# Altium footprint library VEGG_PcbLib_ALT.PcbLib: 140 footprints (part 3 of 9)
Each footprint in its own frame and in the unit in brackets; x right, y up, seen from the top. Pads: shape width x height; smd on the part's side, far side on the other; paste and mask are expansions set on the pad; w line width, h text height; cw(c..) or ccw(c..) is an arc to the next point about the centre after c.
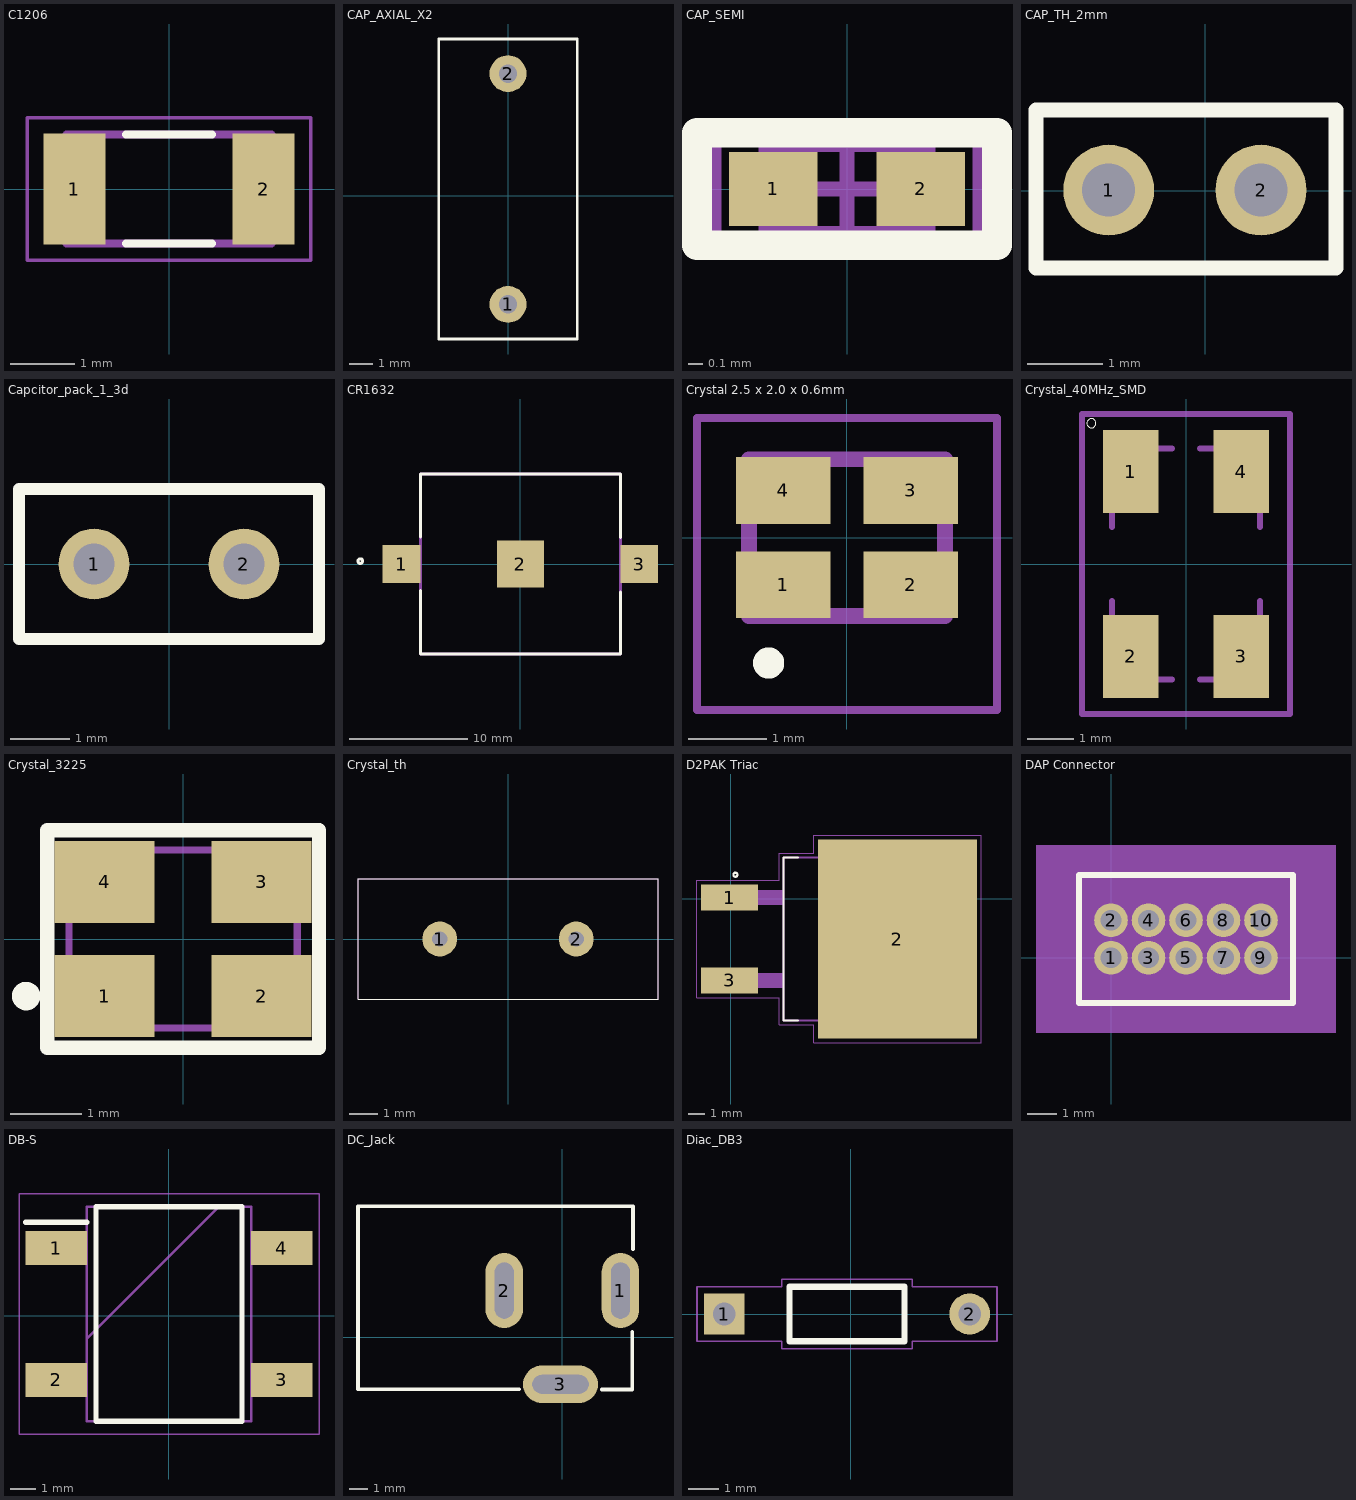
[diagram p2: the footprints below, top view; thin cyan lines are the x and y axes]

## C1206 [mm]
pads (2):
  rect 0.97x1.73 smd: 1(-1.48,0) 2(1.48,0)
Top Overlay:
  lines w0.127: -0.67,-0.85 0.67,-0.85 ; -0.67,0.85 0.67,0.85
Mechanical 4:
  lines w0.127: -1.6,-0.85 1.6,-0.85 ; -1.6,-0.85 -1.6,0.85 ; -1.6,-0.85 1.6,-0.85 ; -1.6,-0.85 -1.6,0.85 ; -1.6,0.85 1.6,0.85 ; -1.6,0.85 1.6,0.85 ; 1.6,-0.85 1.6,0.85 ; 1.6,-0.85 1.6,0.85
Mechanical 16:
  lines w0.05: -2.215,-1.115 2.215,-1.115 2.215,1.115 -2.215,1.115 -2.215,-1.115
3D body "User Library-1206 SMD Capacitor.x_t": height 1, standoff 0, extent -1.6,-0.8 1.6,0.8

## CAP_AXIAL_X2 [mil]
pads (2):
  round 63 hole 31.5: 1(0,-185.04) 2(0,208.66)
Top Overlay:
  lines w5: -118.11,-244.09 -118.11,267.72 118.11,267.72 118.11,-244.09 -118.11,-244.09 ; -118.11,248.03 -118.11,248.03
3D body: height 600, standoff 10, extent -120,-248.19 120,271.81

## CAP_SEMI [mm] "0402_PACK"
pads (2):
  rect 0.6x0.5 smd: 1(-0.5,0) 2(0.5,0)
Top Overlay:
  lines w0.2: -1.016,-0.381 -1.016,0.381 1.016,0.381 1.016,-0.381 -1.016,-0.381
Mechanical 13:
  lines w0.1: -0.55,-0.3 -0.55,0.3 0.55,0.3 0.55,-0.3 -0.55,-0.3
Mechanical 15:
  lines w0.1: -0.3,0 0.3,0 ; 0,-0.3 0,0.3 ; -0.9,-0.35 -0.9,0.35 0.9,0.35 0.9,-0.35 -0.9,-0.35
3D body "SW3dPS-0402 SMD Capacitor.STEP": height 0.12, standoff -0.08, extent -0.5,-0.3 0.5,0.3

## CAP_TH_2mm [mm]
pads (2):
  round 1.2 hole 0.7: 1(-1.275,0.01) 2(0.737,0.01)
Top Overlay:
  lines w0.2: -2.235,-1.016 1.727,-1.016 1.727,1.067 -2.235,1.067 -2.235,-1.016
3D body "User Library-Aluminum Electrolytic Capacitors.STEP": height 13, standoff -0.78, extent -2.979,-2.733 2.522,2.769

## Capcitor_pack_1_3d [mm]
pads (2):
  round 1.2 hole 0.7: 1(-1.27,0) 2(1.27,0)
Top Overlay:
  lines w0.2: -2.54,-1.27 2.54,-1.27 2.54,1.27 -2.54,1.27 -2.54,-1.27
3D body "Capacitor eletrolitico 100uFx35.STEP": height 11.61, standoff -2.39, extent -2.555,-2.56 2.555,2.54

## CR1632 [mm] "3012 keystone"
pads (3):
  rect 3.18x3.18 smd: 1(-10.02,0) 3(10.02,0)
  rect 3.96x3.96 smd: 2(0,0)
Top Overlay:
  circle w0.254: c-13.496,0.246 r0.195
  lines w0.254: -8.43,-2.221 -8.43,-7.585 8.43,-7.585 8.43,-2.366 ; -8.43,2.277 -8.43,7.585 8.43,7.585 8.43,2.241
Mechanical 15:
  lines w0.254: -8.43,-7.585 -8.43,7.585 8.43,7.585 8.43,-7.585 -8.43,-7.585
3D body "User Library-keystone-PN3016.STEP": height 3.95, standoff -0.01, extent -11.659,-8.788 11.558,6.29

## Crystal 2.5 x 2.0 x 0.6mm [mm]
pads (4):
  rect 1.2x0.85 smd: 1(-0.813,-0.6) 2(0.813,-0.6) 3(0.813,0.6) 4(-0.813,0.6)
Top Overlay:
  lines w0.2: -1.1,-1.6 ccw(c-1,-1.6) -0.9,-1.6 ccw(c-1,-1.6) -1.1,-1.6
Mechanical 13:
  lines w0.2: -1.25,-1 -1.25,1 1.25,1 1.25,-1 -1.25,-1
Mechanical 15:
  lines w0.1: -1.912,-2.2 -1.912,1.525 1.913,1.525 1.913,-2.2 -1.912,-2.2
3D body "ABM10W-40.0000MHZ-4-K1Z-T3.stp": height 0.7, standoff 0, extent -1.328,-1 1.328,1

## Crystal_40MHz_SMD [mm]
pads (4):
  rect 1.2x1.8 smd: 1(-1.2,2) 2(-1.2,-2) 3(1.2,-2) 4(1.2,2)
Top Overlay:
  circle w0: c-2.05,3.05 r0.1
Mechanical 1:
  lines w0.127: -1.6,-0.8 -1.6,-2.2 cw(c-1.6,-2.5) -1.3,-2.5 -0.3,-2.5 ; -1.6,0.8 -1.6,2.2 ccw(c-1.6,2.5) -1.3,2.5 -0.3,2.5 ; 0.3,-2.5 1.3,-2.5 cw(c1.6,-2.5) 1.6,-2.2 1.6,-0.8 ; 0.3,2.5 1.3,2.5 ccw(c1.6,2.5) 1.6,2.2 1.6,0.8
Mechanical 4:
  lines w0.127: -2.25,-3.25 -2.25,3.25 2.25,3.25 2.25,-3.25 -2.25,-3.25
3D body: height 0.25, standoff 0, extent -0.254,1.143 -0.254,1.143
3D body "User Library-ABM3B.STEP": height 1.03, standoff -0.06, extent -1.61,-2.52 1.59,2.48

## Crystal_3225 [mm] "3225 pack"
pads (4):
  rect 1.4x1.15 smd: 1(-1.1,-0.8) 2(1.1,-0.8) 3(1.1,0.8) 4(-1.1,0.8)
Top Overlay:
  circle w0.2: c-2.2,-0.8 r0.1
  lines w0.2: -1.905,-1.524 -1.905,1.524 1.905,1.524 1.905,-1.524 -1.905,-1.524
Mechanical 15:
  lines w0.1: -1.6,-1.25 -1.6,1.25 1.6,1.25 1.6,-1.25 -1.6,-1.25
3D body "User Library-tsx-3225.STEP": height 0.52, standoff -0.08, extent -1.6,-1.23 1.6,1.27

## Crystal_th [mm] "ESP mesh test Crystal"
pads (2):
  round 1.25 hole 0.55: 1(-2.438,0) 2(2.438,0)
Top Overlay:
  lines w0.025: -5.359,-2.159 5.359,-2.159 5.359,2.159 -5.359,2.159 -5.359,-2.159
Mechanical 8:
  lines w0.025: -5.359,-2.159 5.359,-2.159 5.359,2.159 -5.359,2.159 -5.359,-2.159
3D body "User Library-HC49S.STEP": height 3.63, standoff -1.97, extent -5.5,-2.325 5.672,2.348

## D2PAK Triac [mm] "T850-6G"
pads (3):
  rect 3.5x1.6 smd: 1(-0.071,0.076) 3(-0.071,-5.004)
  rect 9.75x12.2 smd: 2(10.204,-2.464)
Top Overlay:
  circle w0.127: c0.279,1.473 r0.127
  lines w0.127: 4.115,-7.464 3.229,-7.464 3.229,2.536 4.115,2.536
Top Paste:
  region: 12.479,-0.699 13.849,-0.699 13.849,-2.168 12.479,-2.168
  region: 12.473,-2.759 13.849,-2.759 13.849,-4.23 12.473,-4.23
  region: 11.879,-4.231 10.504,-4.231 10.504,-2.759 11.879,-2.759
  region: 11.879,-2.168 10.506,-2.168 10.506,-0.699 11.879,-0.699
  region: 11.879,-0.101 10.503,-0.101 10.503,1.366 11.879,1.366
  region: 12.474,1.366 13.849,1.366 13.849,-0.102 12.474,-0.102
  region: 11.879,-6.3 10.506,-6.3 10.506,-4.824 11.879,-4.824
  region: 12.48,-4.824 13.849,-4.824 13.849,-6.301 12.48,-6.301
  region: 7.939,-4.23 6.559,-4.23 6.559,-2.759 7.939,-2.759
  region: 7.939,-2.168 6.559,-2.168 6.559,-0.699 7.939,-0.699
  region: 8.532,-0.699 9.909,-0.699 9.909,-2.168 8.532,-2.168
  region: 8.531,-2.759 9.909,-2.759 9.909,-4.23 8.531,-4.23
  region: 8.532,-4.824 9.909,-4.824 9.909,-6.298 8.532,-6.298
  region: 7.939,-6.298 6.559,-6.298 6.559,-4.824 7.939,-4.824
  region: 8.531,1.366 9.909,1.366 9.909,-0.102 8.531,-0.102
  region: 7.939,-0.102 6.559,-0.102 6.559,1.366 7.939,1.366
Mechanical 4:
  region: -1.586,0.526 3.229,0.526 3.229,-0.37 -1.586,-0.37
  region: -1.587,-4.554 3.229,-4.554 3.229,-5.46 -1.587,-5.46
  region: -1.586,0.526 3.229,0.526 3.229,-0.37 -1.586,-0.37
  region: -1.587,-4.554 3.229,-4.554 3.229,-5.46 -1.587,-5.46
  lines w0.127: 3.229,-7.464 14.029,-7.464 ; 3.229,-7.464 3.229,2.536 ; 3.229,-7.464 14.029,-7.464 ; 3.229,-7.464 3.229,2.536 ; 3.229,2.536 14.029,2.536 ; 3.229,2.536 14.029,2.536 ; 14.029,-7.464 14.029,2.536 ; 14.029,-7.464 14.029,2.536
Mechanical 16:
  lines w0.05: -2.071,-6.064 2.979,-6.064 2.979,-7.714 5.079,-7.714 5.079,-8.814 15.329,-8.814 15.329,3.886 5.079,3.886 5.079,2.786 2.979,2.786 2.979,1.136 -2.071,1.136 -2.071,-6.064
3D body: height 0.25, standoff 0, extent 21.666,-0.152 21.666,-0.152
3D body "TO263-2-1.stp": height 4.22, standoff 0, extent -1.086,-7.349 13.499,2.472

## DAP Connector [mil] "XMC1100 programmer connector 10 pin"
pads (10):
  round 45 hole 27.95: 1(0,0) 2(0,50) 3(50,0) 4(50,50) 5(100,0) 6(100,50) 7(150,0) 8(150,50) 9(200,0) 10(200,50)
Top Overlay:
  lines w7.87: -42.72,-60.24 -42.72,110.24 242.72,110.24 242.72,-60.24 -42.72,-60.24
Top Solder:
  circle w0: c200,50 r24.51
  circle w0: c200,0 r24.51
  circle w0: c150,50 r24.51
  circle w0: c150,0 r24.51
  circle w0: c100,50 r24.51
  circle w0: c100,0 r24.51
  circle w0: c50,50 r24.51
  circle w0: c50,0 r24.51
  circle w0: c0,50 r24.51
  circle w0: c0,0 r24.51
Bottom Solder:
  circle w0: c200,50 r24.51
  circle w0: c200,0 r24.51
  circle w0: c150,50 r24.51
  circle w0: c150,0 r24.51
  circle w0: c100,50 r24.51
  circle w0: c100,0 r24.51
  circle w0: c50,50 r24.51
  circle w0: c50,0 r24.51
  circle w0: c0,50 r24.51
  circle w0: c0,0 r24.51
Mechanical 1:
  region: -100,-100 -100,150 300,150 300,-100
  lines w3.94: -25,-42.48 -25,92.48 ; -25,-42.48 25,-42.48 ; -25,-42.48 25,-42.48 ; -25,92.48 25,92.48 ; -25,92.48 25,92.48 ; -7.99,-7.99 -7.99,7.99 ; -7.99,-7.99 7.99,-7.99 ; -7.99,-7.99 7.99,-7.99 ; -7.99,-7.99 -7.99,7.99 ; -7.99,7.99 7.99,7.99 ; -7.99,7.99 7.99,7.99 ; -7.99,42.01 -7.99,57.99 ; -7.99,42.01 7.99,42.01 ; -7.99,42.01 7.99,42.01 ; -7.99,42.01 -7.99,57.99 ; -7.99,57.99 7.99,57.99 ; -7.99,57.99 7.99,57.99 ; 7.99,-7.99 7.99,7.99 ; 7.99,-7.99 7.99,7.99 ; 7.99,42.01 7.99,57.99 ; 7.99,42.01 7.99,57.99 ; 25,-42.48 75,-42.48 ; 25,-42.48 75,-42.48 ; 25,92.48 75,92.48 ; 25,92.48 75,92.48 ; 42.01,-7.99 42.01,7.99 ; 42.01,-7.99 57.99,-7.99 ; 42.01,-7.99 57.99,-7.99 ; 42.01,-7.99 42.01,7.99 ; 42.01,7.99 57.99,7.99 ; 42.01,7.99 57.99,7.99 ; 42.01,42.01 42.01,57.99 ; 42.01,42.01 57.99,42.01 ; 42.01,42.01 57.99,42.01 ; 42.01,42.01 42.01,57.99 ; 42.01,57.99 57.99,57.99 ; 42.01,57.99 57.99,57.99 ; 57.99,-7.99 57.99,7.99 ; 57.99,-7.99 57.99,7.99 ; 57.99,42.01 57.99,57.99 ; 57.99,42.01 57.99,57.99 ; 75,-42.48 125,-42.48 ; 75,-42.48 125,-42.48 ; 75,92.48 125,92.48 ; 75,92.48 125,92.48 ; 92.01,-7.99 92.01,7.99 ; 92.01,-7.99 107.99,-7.99 ; 92.01,-7.99 107.99,-7.99 ; 92.01,-7.99 92.01,7.99 ; 92.01,7.99 107.99,7.99 ; 92.01,7.99 107.99,7.99 ; 92.01,42.01 92.01,57.99 ; 92.01,42.01 107.99,42.01 ; 92.01,42.01 107.99,42.01 ; 92.01,42.01 92.01,57.99 ; 92.01,57.99 107.99,57.99 ; 92.01,57.99 107.99,57.99 ; 107.99,-7.99 107.99,7.99 ; 107.99,-7.99 107.99,7.99 ; 107.99,42.01 107.99,57.99 ; 107.99,42.01 107.99,57.99 ; 125,-42.48 175,-42.48 ; 125,-42.48 175,-42.48 ; 125,92.48 175,92.48 ; 125,92.48 175,92.48 ; 142.01,-7.99 142.01,7.99 ; 142.01,-7.99 157.99,-7.99 ; 142.01,-7.99 157.99,-7.99 ; 142.01,-7.99 142.01,7.99 ; 142.01,7.99 157.99,7.99 ; 142.01,7.99 157.99,7.99 ; 142.01,42.01 142.01,57.99 ; 142.01,42.01 157.99,42.01 ; 142.01,42.01 157.99,42.01 ; 142.01,42.01 142.01,57.99 ; 142.01,57.99 157.99,57.99 ; 142.01,57.99 157.99,57.99 ; 157.99,-7.99 157.99,7.99 ; 157.99,-7.99 157.99,7.99 ; 157.99,42.01 157.99,57.99 ; 157.99,42.01 157.99,57.99 ; 175,-42.48 225,-42.48 225,92.48 175,92.48 ; 192.01,-7.99 192.01,7.99 207.99,7.99 207.99,-7.99 192.01,-7.99 ; 192.01,42.01 192.01,57.99 207.99,57.99 207.99,42.01 192.01,42.01
Mechanical 4:
  region: -26.97,-44.49 -26.97,94.49 226.97,94.49 226.97,-44.49

## DB-S [mm] "Rectifier IC"
pads (4):
  rect 2.375x1.3 smd: 1(-4.362,2.614) 2(-4.362,-2.486) 3(4.362,-2.486) 4(4.362,2.614)
Top Overlay:
  lines w0.2: -5.55,3.614 -3.175,3.614 ; -2.825,-4.086 -2.825,4.214 2.825,4.214 2.825,-4.086 -2.825,-4.086
Mechanical 15:
  lines w0.1: -3.175,-0.886 1.925,4.214 ; -3.175,-4.086 -3.175,4.214 3.175,4.214 3.175,-4.086 -3.175,-4.086
Mechanical 20:
  lines w0.05: -5.8,-4.586 -5.8,4.714 5.8,4.714 5.8,-4.586 -5.8,-4.586
3D body "DB107S.stp": height 3.4, standoff 0, extent -4.95,-4.15 4.95,4.15

## DC_Jack [mm]
pads (3):
  oval 2x4 hole 1 slot 3 at 90 deg: 1(3.1,2.5) 2(-3.1,2.5)
  oval 4x2 hole 1 slot 3 at 0 deg: 3(-0.1,-2.5)
Top Overlay:
  lines w0.2: -2.3,-2.764 -10.899,-2.764 -10.899,7 3.766,7 3.766,4.7 ; 2.1,-2.773 3.731,-2.773 3.731,0.3
3D body "CUI_PJ-050A.step": height 11, standoff -2.2, extent -10.776,-2.631 3.624,6.869

## Diac_DB3 [mm]
pads (2):
  rect 1.35x1.35 hole 0.75: 1(-4.177,0)
  round 1.35 hole 0.75: 2(3.923,0)
Top Overlay:
  lines w0.2: -2.027,-0.9 1.773,-0.9 1.773,0.9 -2.027,0.9 -2.027,-0.9
Mechanical 4:
  lines w0.05: -5.077,-0.9 -5.077,0.9 -2.277,0.9 -2.277,1.15 2.023,1.15 2.023,0.9 4.823,0.9 4.823,-0.9 2.023,-0.9 2.023,-1.15 -2.277,-1.15 -2.277,-0.9 -5.077,-0.9

## Dipole antenna [mm]
3D body: height 13.58, standoff 12.06, extent -25.87,-0.354 -0.47,1.167
3D body: height 13.59, standoff 12.06, extent -1.233,-0.353 0.291,1.165
3D body: height 0.25, standoff 0, extent -0.025,0.076 -0.025,0.076
3D body: height 12.7, standoff 0, extent -1.226,-0.354 0.292,1.167